# Altium schematic symbol library Diodes - TVS.SchLib: 5379 symbols (part 11 of 35) (continued)
## SD12-7 (continued)
TVS DIODE 12V 25V SOD323; Manufacturer: Diodes Incorporated; Capacitance @ Frequency: 150pF @ 1MHz; Current - Peak Pulse (10/1000µs): 15A (8/20µs); Power Line Protection: No; Power - Peak Pulse: 350W; Type: Zener; Unidirectional Channels: 1; Voltage - Breakdown (Min): 13.3V; Voltage - Reverse Standoff (Typ): 12V (Max); Part Number: SD12-7; Applications: General Purpose; ComponentLink1Description: Datasheet; ComponentLink1URL: https://www.diodes.com/assets/Datasheets/ds31772.pdf; ComponentLink2Description: DigiKey Link; ComponentLink2URL: http://digikey.com/product-detail/en/diodes-incorporated/SD12-7/SD12-7DICT-ND/5030159; LastUpdated: 9/2/2020 1:28:26 AM; Lifecycle Status: Active; Minimum Order: 1; Mounting Type: Surface Mount; Operating Temperature: -55°C ~ 150°C (TJ); Package / Case: SC-76, SOD-323; Packaging: TapeAndReel; PartId: 9842; Part Status: Active; Price: 0.07; Series: -; Supplier 1: DigiKey; Supplier Part Number 1: SD12-7DICT-ND; Supplier Device Package: SOD-323; Voltage - Clamping (Max) @ Ipp: 25V
footprint SOD323
pins: 1, 2

## SD12.TCT
designator D?
TVS DIODE 12V 25V SOD323; Manufacturer: Semtech Corporation; Capacitance @ Frequency: 150pF @ 1MHz; Current - Peak Pulse (10/1000µs): 15A (8/20µs); Power Line Protection: No; Power - Peak Pulse: 350W; Type: Zener; Unidirectional Channels: 1; Voltage - Breakdown (Min): 13.3V; Voltage - Reverse Standoff (Typ): 12V (Max); Part Number: SD12.TCT; Applications: General Purpose; ComponentLink1Description: Datasheet; ComponentLink1URL: https://www.semtech.com/uploads/documents/sdxx.pdf; ComponentLink2Description: DigiKey Link; ComponentLink2URL: http://digikey.com/product-detail/en/semtech-corporation/SD12.TCT/SD12.TCTCT-ND/5113731; LastUpdated: 9/2/2020 1:28:26 AM; Lifecycle Status: Active; Minimum Order: 1; Mounting Type: Surface Mount; Operating Temperature: -55°C ~ 125°C (TJ); Package / Case: SC-76, SOD-323; Packaging: TapeAndReel; PartId: 9851; Part Status: Active; Price: 0.33; Series: -; Supplier 1: DigiKey; Supplier Part Number 1: SD12.TCTCT-ND; Supplier Device Package: SOD-323; Voltage - Clamping (Max) @ Ipp: 25V
footprint SOD323
pins: 1, 2

## SD12C-01FTG
designator D?
TVS DIODE 12V 23V SOD323; Manufacturer: Littelfuse Inc.; Bidirectional Channels: 1; Capacitance @ Frequency: 100pF @ 1MHz; Current - Peak Pulse (10/1000µs): 17A (8/20µs); Power Line Protection: No; Power - Peak Pulse: 450W; Type: Zener; Voltage - Reverse Standoff (Typ): 12V (Max); Part Number: SD12C-01FTG; Applications: Automotive; ComponentLink1Description: Datasheet; ComponentLink1URL: https://www.littelfuse.com/~/media/electronics/datasheets/tvs_diode_arrays/littelfuse_tvs_diode_array_sd_c_datasheet.pdf.pdf; ComponentLink2Description: DigiKey Link; ComponentLink2URL: http://digikey.com/product-detail/en/littelfuse-inc/SD12C-01FTG/F6442CT-ND/5019594; LastUpdated: 9/2/2020 1:28:29 AM; Lifecycle Status: Active; Minimum Order: 1; Mounting Type: Surface Mount; Operating Temperature: -40°C ~ 125°C (TJ); Package / Case: SC-76, SOD-323; Packaging: TapeAndReel; PartId: 9965; Part Status: Active; Price: 0.12; Series: Automotive, AEC-Q101, SD-C, SPA®; Supplier 1: DigiKey; Supplier Part Number 1: F6442CT-ND; Supplier Device Package: SOD-323; Voltage - Clamping (Max) @ Ipp: 23V
footprint SOD323
pins: 1, 2

## SD12C-TP
designator D?
12V, ESD PROTECTION DEVICES, SOD; Manufacturer: Micro Commercial Co; Bidirectional Channels: 1; Capacitance @ Frequency: 100pF @ 1MHz (Max); Current - Peak Pulse (10/1000µs): 18A (8/20µs); Power Line Protection: No; Power - Peak Pulse: 500W; Type: Zener; Voltage - Breakdown (Min): 13.3V; Voltage - Clamping (Max) @ Ipp: 28V; Voltage - Reverse Standoff (Typ): 12V (Max); Part Number: SD12C-TP; Applications: General Purpose; ComponentLink2Description: DigiKey Link; ComponentLink2URL: http://digikey.com/product-detail/en/micro-commercial-co/SD12C-TP/353-SD12C-TPCT-ND/12177312; LastUpdated: 8/30/2020 9:07:52 PM; Lifecycle Status: Active; Minimum Order: 1; Mounting Type: Surface Mount; Operating Temperature: -55°C ~ 125°C (TJ); Package / Case: SC-76, SOD-323; Packaging: Unknown; PartId: 11458; Price: 0.07; Supplier 1: DigiKey; Supplier Part Number 1: 353-SD12C-TPCT-ND; Supplier Device Package: SOD-323
footprint SOD323
pins: 1, 2

## SD12C.TCT
designator D?
TVS DIODE 12V 24V SOD323; Manufacturer: Semtech Corporation; Bidirectional Channels: 1; Capacitance @ Frequency: 100pF @ 1MHz; Current - Peak Pulse (10/1000µs): 15A (8/20µs); Power Line Protection: No; Power - Peak Pulse: 350W; Type: Zener; Voltage - Breakdown (Min): 13.3V; Voltage - Reverse Standoff (Typ): 12V (Max); Part Number: SD12C.TCT; Applications: General Purpose; ComponentLink1Description: Datasheet; ComponentLink1URL: https://www.semtech.com/uploads/documents/sdxxc.pdf; ComponentLink2Description: DigiKey Link; ComponentLink2URL: http://digikey.com/product-detail/en/semtech-corporation/SD12C.TCT/SD12C.TCTCT-ND/5113732; LastUpdated: 9/2/2020 1:28:28 AM; Lifecycle Status: Active; Minimum Order: 1; Mounting Type: Surface Mount; Operating Temperature: -55°C ~ 125°C (TJ); Package / Case: SC-76, SOD-323; Packaging: TapeAndReel; PartId: 9916; Part Status: Active; Price: 0.36; Series: -; Supplier 1: DigiKey; Supplier Part Number 1: SD12C.TCTCT-ND; Supplier Device Package: SOD-323; Voltage - Clamping (Max) @ Ipp: 24V
footprint SOD323
pins: 1, 2

## SD12T1G
designator D?
TVS DIODE 12V 19V SOD323; Manufacturer: ON Semiconductor; Capacitance @ Frequency: 150pF @ 1MHz; Current - Peak Pulse (10/1000µs): 15A (8/20µs); Power Line Protection: No; Power - Peak Pulse: 350W; Type: Zener; Unidirectional Channels: 1; Voltage - Breakdown (Min): 13.3V; Part Number: SD12T1G; Applications: Automotive; ComponentLink1Description: Datasheet; ComponentLink1URL: https://www.onsemi.com/pub/Collateral/SD05T1-D.PDF; ComponentLink2Description: DigiKey Link; ComponentLink2URL: http://digikey.com/product-detail/en/on-semiconductor/SD12T1G/SD12T1GOSCT-ND/964631; LastUpdated: 9/2/2020 1:28:27 AM; Lifecycle Status: Active; Minimum Order: 1; Mounting Type: Surface Mount; Operating Temperature: -55°C ~ 150°C (TJ); Package / Case: SC-76, SOD-323; Packaging: TapeAndReel; PartId: 9856; Part Status: Active; Price: 0.08; Series: Automotive, AEC-Q101; Supplier 1: DigiKey; Supplier Part Number 1: SD12T1GOSCT-ND; Supplier Device Package: SOD-323; Voltage - Clamping (Max) @ Ipp: 19V; Voltage - Reverse Standoff (Typ): 12V
footprint SOD323
pins: 1, 2

## SD15-01FTG
designator D?
TVS DIODE 15V 30V SOD323; Manufacturer: Littelfuse Inc.; Capacitance @ Frequency: 100pF @ 1MHz; Current - Peak Pulse (10/1000µs): 12A (8/20µs); Power Line Protection: No; Power - Peak Pulse: 450W; Type: Zener; Unidirectional Channels: 1; Voltage - Reverse Standoff (Typ): 15V (Max); Part Number: SD15-01FTG; Applications: General Purpose; ComponentLink1Description: Datasheet; ComponentLink1URL: https://www.littelfuse.com/~/media/electronics/datasheets/tvs_diode_arrays/littelfuse_tvs_diode_array_sd_datasheet.pdf.pdf; ComponentLink2Description: DigiKey Link; ComponentLink2URL: http://digikey.com/product-detail/en/littelfuse-inc/SD15-01FTG/F6443CT-ND/5019596; LastUpdated: 9/2/2020 1:28:27 AM; Lifecycle Status: Active; Minimum Order: 1; Mounting Type: Surface Mount; Operating Temperature: -40°C ~ 125°C (TJ); Package / Case: SC-76, SOD-323; Packaging: TapeAndReel; PartId: 9874; Part Status: Active; Price: 0.11; Series: SD, SPA®; Supplier 1: DigiKey; Supplier Part Number 1: F6443CT-ND; Supplier Device Package: SOD-323; Voltage - Clamping (Max) @ Ipp: 30V
footprint SOD323
pins: 1, 2

## SD15C-01FTG
designator D?
TVS DIODE 15V 31V SOD323; Manufacturer: Littelfuse Inc.; Bidirectional Channels: 1; Capacitance @ Frequency: 75pF @ 1MHz; Current - Peak Pulse (10/1000µs): 12A (8/20µs); Power Line Protection: No; Power - Peak Pulse: 450W; Type: Zener; Voltage - Reverse Standoff (Typ): 15V (Max); Part Number: SD15C-01FTG; Applications: Automotive; ComponentLink1Description: Datasheet; ComponentLink1URL: https://www.littelfuse.com/~/media/electronics/datasheets/tvs_diode_arrays/littelfuse_tvs_diode_array_sd_c_datasheet.pdf.pdf; ComponentLink2Description: DigiKey Link; ComponentLink2URL: http://digikey.com/product-detail/en/littelfuse-inc/SD15C-01FTG/F6444CT-ND/5019598; LastUpdated: 9/2/2020 1:28:29 AM; Lifecycle Status: Active; Minimum Order: 1; Mounting Type: Surface Mount; Operating Temperature: -40°C ~ 125°C (TJ); Package / Case: SC-76, SOD-323; Packaging: TapeAndReel; PartId: 9989; Part Status: Active; Price: 0.12; Series: Automotive, AEC-Q101, SD-C, SPA®; Supplier 1: DigiKey; Supplier Part Number 1: F6444CT-ND; Supplier Device Package: SOD-323; Voltage - Clamping (Max) @ Ipp: 31V
footprint SOD323
pins: 1, 2

## SD15C-TP
designator D?
ESDPROTECTIONDEVICESSOD-323; Manufacturer: Micro Commercial Co; Bidirectional Channels: 1; Capacitance @ Frequency: 75pF @ 1MHz (Max); Current - Peak Pulse (10/1000µs): 12A (8/20µs); Power Line Protection: No; Power - Peak Pulse: 350W; Type: Zener; Voltage - Breakdown (Min): 16.7V; Voltage - Clamping (Max) @ Ipp: 40V; Voltage - Reverse Standoff (Typ): 15V (Max); Part Number: SD15C-TP; Applications: General Purpose; ComponentLink1Description: Datasheet; ComponentLink1URL: https://www.mccsemi.com/pdf/Products/SD15C~SD24C(SOD-323)-V1.pdf; ComponentLink2Description: DigiKey Link; ComponentLink2URL: http://digikey.com/product-detail/en/micro-commercial-co/SD15C-TP/SD15C-TPMSCT-ND/10054390; LastUpdated: 9/2/2020 1:28:29 AM; Lifecycle Status: Active; Minimum Order: 1; Mounting Type: Surface Mount; Operating Temperature: -55°C ~ 125°C (TJ); Package / Case: SC-76, SOD-323; Packaging: TapeAndReel; PartId: 9982; Part Status: Active; Price: 0.08; Series: -; Supplier 1: DigiKey; Supplier Part Number 1: SD15C-TPMSCT-ND; Supplier Device Package: SOD-323
footprint SOD323
pins: 1, 2

## SD15C.TCT
designator D?
TVS DIODE 15V 29V SOD323; Manufacturer: Semtech Corporation; Bidirectional Channels: 1; Capacitance @ Frequency: 75pF @ 1MHz; Current - Peak Pulse (10/1000µs): 12A (8/20µs); Power Line Protection: No; Power - Peak Pulse: 350W; Type: Zener; Voltage - Breakdown (Min): 16.7V; Voltage - Reverse Standoff (Typ): 15V (Max); Part Number: SD15C.TCT; Applications: General Purpose; ComponentLink1Description: Datasheet; ComponentLink1URL: https://www.semtech.com/uploads/documents/sdxxc.pdf; ComponentLink2Description: DigiKey Link; ComponentLink2URL: http://digikey.com/product-detail/en/semtech-corporation/SD15C.TCT/SD15C.TCTCT-ND/5113733; LastUpdated: 9/2/2020 1:28:28 AM; Lifecycle Status: Active; Minimum Order: 1; Mounting Type: Surface Mount; Operating Temperature: -55°C ~ 125°C (TJ); Package / Case: SC-76, SOD-323; Packaging: TapeAndReel; PartId: 9915; Part Status: Active; Price: 0.36; Series: -; Supplier 1: DigiKey; Supplier Part Number 1: SD15C.TCTCT-ND; Supplier Device Package: SOD-323; Voltage - Clamping (Max) @ Ipp: 29V
footprint SOD323
pins: 1, 2

## SD24-01FTG
designator D?
TVS DIODE 24V 42V SOD323; Manufacturer: Littelfuse Inc.; Capacitance @ Frequency: 65pF @ 1MHz; Current - Peak Pulse (10/1000µs): 7A (8/20µs); Power Line Protection: No; Power - Peak Pulse: 450W; Type: Zener; Unidirectional Channels: 1; Voltage - Reverse Standoff (Typ): 24V (Max); Part Number: SD24-01FTG; Applications: General Purpose; ComponentLink1Description: Datasheet; ComponentLink1URL: https://www.littelfuse.com/~/media/electronics/datasheets/tvs_diode_arrays/littelfuse_tvs_diode_array_sd_datasheet.pdf.pdf; ComponentLink2Description: DigiKey Link; ComponentLink2URL: http://digikey.com/product-detail/en/littelfuse-inc/SD24-01FTG/F6445CT-ND/5019600; LastUpdated: 9/2/2020 1:28:27 AM; Lifecycle Status: Active; Minimum Order: 1; Mounting Type: Surface Mount; Operating Temperature: -40°C ~ 125°C (TJ); Package / Case: SC-76, SOD-323; Packaging: TapeAndReel; PartId: 9912; Part Status: Active; Price: 0.11; Series: SD, SPA®; Supplier 1: DigiKey; Supplier Part Number 1: F6445CT-ND; Supplier Device Package: SOD-323; Voltage - Clamping (Max) @ Ipp: 42V
footprint SOD323
pins: 1, 2

## SD24-7
designator D?
SURGE PROTECTION PP SOD323; Manufacturer: Diodes Incorporated; Capacitance @ Frequency: 80pF @ 1MHz (Max); Current - Peak Pulse (10/1000µs): 8A (8/20µs); Power Line Protection: No; Power - Peak Pulse: 350W; Type: Zener; Unidirectional Channels: 1; Voltage - Breakdown (Min): 26V; Voltage - Clamping (Max) @ Ipp: 44V; Voltage - Reverse Standoff (Typ): 24V (Max); Part Number: SD24-7; Applications: General Purpose; ComponentLink1Description: Datasheet; ComponentLink1URL: https://www.diodes.com/assets/Datasheets/SD24.pdf; ComponentLink2Description: DigiKey Link; ComponentLink2URL: http://digikey.com/product-detail/en/diodes-incorporated/SD24-7/31-SD24-7CT-ND/11643306; LastUpdated: 8/30/2020 9:07:50 PM; Lifecycle Status: Active; Minimum Order: 1; Mounting Type: Surface Mount; Package / Case: SC-76, SOD-323; Packaging: TapeAndReel; PartId: 11455; Price: 0.10; Supplier 1: DigiKey; Supplier Part Number 1: 31-SD24-7CT-ND; Supplier Device Package: SOD-323
footprint SOD323
pins: 1, 2

## SD24C-01FTG
designator D?
TVS DIODE 24V 42V SOD323; Manufacturer: Littelfuse Inc.; Bidirectional Channels: 1; Capacitance @ Frequency: 50pF @ 1MHz; Current - Peak Pulse (10/1000µs): 7A (8/20µs); Power Line Protection: No; Power - Peak Pulse: 450W; Type: Zener; Voltage - Reverse Standoff (Typ): 24V (Max); Part Number: SD24C-01FTG; Applications: Automotive; ComponentLink1Description: Datasheet; ComponentLink1URL: https://www.littelfuse.com/~/media/electronics/datasheets/tvs_diode_arrays/littelfuse_tvs_diode_array_sd_c_datasheet.pdf.pdf; ComponentLink2Description: DigiKey Link; ComponentLink2URL: http://digikey.com/product-detail/en/littelfuse-inc/SD24C-01FTG/F6446CT-ND/5019602; LastUpdated: 9/2/2020 1:28:29 AM; Lifecycle Status: Active; Minimum Order: 1; Mounting Type: Surface Mount; Operating Temperature: -40°C ~ 125°C (TJ); Package / Case: SC-76, SOD-323; Packaging: TapeAndReel; PartId: 9990; Part Status: Active; Price: 0.12; Series: Automotive, AEC-Q101, SD-C, SPA®; Supplier 1: DigiKey; Supplier Part Number 1: F6446CT-ND; Supplier Device Package: SOD-323; Voltage - Clamping (Max) @ Ipp: 42V
footprint SOD323
pins: 1, 2

## SD24C-7
designator D?
GENERAL PROTECTION PP SOD323; Manufacturer: Diodes Incorporated; Bidirectional Channels: 1; Capacitance @ Frequency: 40pF @ 1MHz (Max); Current - Peak Pulse (10/1000µs): 8A (8/20µs); Power Line Protection: No; Power - Peak Pulse: 350W; Type: Zener; Voltage - Breakdown (Min): 26.7V; Voltage - Clamping (Max) @ Ipp: 45V; Voltage - Reverse Standoff (Typ): 24V (Max); Part Number: SD24C-7; Applications: General Purpose; ComponentLink1Description: Datasheet; ComponentLink1URL: https://www.diodes.com/assets/Datasheets/SD24C.pdf; ComponentLink2Description: DigiKey Link; ComponentLink2URL: http://digikey.com/product-detail/en/diodes-incorporated/SD24C-7/31-SD24C-7CT-ND/10706907; LastUpdated: 9/2/2020 1:28:28 AM; Lifecycle Status: Active; Minimum Order: 1; Mounting Type: Surface Mount; Operating Temperature: -65°C ~ 150°C (TJ); Package / Case: SC-76, SOD-323; Packaging: TapeAndReel; PartId: 9913; Part Status: Active; Price: 0.11; Series: -; Supplier 1: DigiKey; Supplier Part Number 1: 31-SD24C-7CT-ND; Supplier Device Package: SOD-323
footprint SOD323
pins: 1, 2

## SD24C-TP
designator D?
24V,ESD PROTECTION DEVICES,SOD-3; Manufacturer: Micro Commercial Co; Bidirectional Channels: 1; Capacitance @ Frequency: 50pF @ 1MHz (Max); Current - Peak Pulse (10/1000µs): 8A (8/20µs); Power Line Protection: No; Power - Peak Pulse: 350W; Type: Zener; Voltage - Breakdown (Min): 26.7V; Voltage - Clamping (Max) @ Ipp: 62V; Voltage - Reverse Standoff (Typ): 24V (Max); Part Number: SD24C-TP; Applications: General Purpose; ComponentLink1Description: Datasheet; ComponentLink1URL: https://www.mccsemi.com/pdf/Products/SD15C~SD24C(SOD-323)-C.pdf; ComponentLink2Description: DigiKey Link; ComponentLink2URL: http://digikey.com/product-detail/en/micro-commercial-co/SD24C-TP/SD24C-TPMSCT-ND/8554546; LastUpdated: 9/2/2020 1:28:29 AM; Lifecycle Status: Active; Minimum Order: 1; Mounting Type: Surface Mount; Operating Temperature: -55°C ~ 125°C (TJ); Package / Case: SC-76, SOD-323; Packaging: TapeAndReel; PartId: 9977; Part Status: Active; Price: 0.08; Series: -; Supplier 1: DigiKey; Supplier Part Number 1: SD24C-TPMSCT-ND; Supplier Device Package: SOD-323
footprint SOD323
pins: 1, 2

## SD24C.TCT
designator D?
TVS DIODE 24V 44V SOD323; Manufacturer: Semtech Corporation; Bidirectional Channels: 1; Capacitance @ Frequency: 50pF @ 1MHz; Current - Peak Pulse (10/1000µs): 8A (8/20µs); Power Line Protection: No; Power - Peak Pulse: 350W; Type: Zener; Voltage - Breakdown (Min): 26.7V; Voltage - Reverse Standoff (Typ): 24V (Max); Part Number: SD24C.TCT; Applications: General Purpose; ComponentLink1Description: Datasheet; ComponentLink1URL: https://www.semtech.com/uploads/documents/sdxxc.pdf; ComponentLink2Description: DigiKey Link; ComponentLink2URL: http://digikey.com/product-detail/en/semtech-corporation/SD24C.TCT/SD24CCT-ND/1000967; LastUpdated: 9/2/2020 1:28:29 AM; Lifecycle Status: Active; Minimum Order: 1; Mounting Type: Surface Mount; Operating Temperature: -55°C ~ 125°C (TJ); Package / Case: SC-76, SOD-323; Packaging: TapeAndReel; PartId: 9961; Part Status: Active; Price: 0.33; Series: -; Supplier 1: DigiKey; Supplier Part Number 1: SD24CCT-ND; Supplier Device Package: SOD-323; Voltage - Clamping (Max) @ Ipp: 44V
footprint SOD323
pins: 1, 2

## SD36-01FTG
designator D?
TVS DIODE 36V 62V SOD323; Manufacturer: Littelfuse Inc.; Capacitance @ Frequency: 50pF @ 1MHz; Current - Peak Pulse (10/1000µs): 5A (8/20µs); Power Line Protection: No; Power - Peak Pulse: 450W; Type: Zener; Unidirectional Channels: 1; Voltage - Reverse Standoff (Typ): 36V (Max); Part Number: SD36-01FTG; Applications: General Purpose; ComponentLink1Description: Datasheet; ComponentLink1URL: https://www.littelfuse.com/~/media/electronics/datasheets/tvs_diode_arrays/littelfuse_tvs_diode_array_sd_datasheet.pdf.pdf; ComponentLink2Description: DigiKey Link; ComponentLink2URL: http://digikey.com/product-detail/en/littelfuse-inc/SD36-01FTG/F6447CT-ND/5019604; LastUpdated: 9/2/2020 1:28:27 AM; Lifecycle Status: Active; Minimum Order: 1; Mounting Type: Surface Mount; Operating Temperature: -40°C ~ 125°C (TJ); Package / Case: SC-76, SOD-323; Packaging: TapeAndReel; PartId: 9873; Part Status: Active; Price: 0.11; Series: SD, SPA®; Supplier 1: DigiKey; Supplier Part Number 1: F6447CT-ND; Supplier Device Package: SOD-323; Voltage - Clamping (Max) @ Ipp: 62V
footprint SOD323
pins: 1, 2

## SD36C-01FTG
designator D?
TVS DIODE 36V 60V SOD323; Manufacturer: Littelfuse Inc.; Bidirectional Channels: 1; Capacitance @ Frequency: 30pF @ 1MHz; Current - Peak Pulse (10/1000µs): 5A (8/20µs); Power Line Protection: No; Power - Peak Pulse: 450W; Type: Zener; Voltage - Reverse Standoff (Typ): 36V (Max); Part Number: SD36C-01FTG; Applications: Automotive; ComponentLink1Description: Datasheet; ComponentLink1URL: https://www.littelfuse.com/~/media/electronics/datasheets/tvs_diode_arrays/littelfuse_tvs_diode_array_sd_c_datasheet.pdf.pdf; ComponentLink2Description: DigiKey Link; ComponentLink2URL: http://digikey.com/product-detail/en/littelfuse-inc/SD36C-01FTG/F6448CT-ND/5019606; LastUpdated: 9/2/2020 1:28:29 AM; Lifecycle Status: Active; Minimum Order: 1; Mounting Type: Surface Mount; Operating Temperature: -40°C ~ 125°C (TJ); Package / Case: SC-76, SOD-323; Packaging: TapeAndReel; PartId: 9988; Part Status: Active; Price: 0.12; Series: Automotive, AEC-Q101, SD-C, SPA®; Supplier 1: DigiKey; Supplier Part Number 1: F6448CT-ND; Supplier Device Package: SOD-323; Voltage - Clamping (Max) @ Ipp: 60V
footprint SOD323
pins: 1, 2

## SD36C-TP
designator D?
ESDPROTECTIONDEVICESSOD-323; Manufacturer: Micro Commercial Co; Bidirectional Channels: 1; Capacitance @ Frequency: 10pF @ 1MHz; Current - Peak Pulse (10/1000µs): 3A (8/20µs); Power Line Protection: No; Power - Peak Pulse: 240W; Type: Zener; Voltage - Breakdown (Min): 40V; Voltage - Clamping (Max) @ Ipp: 80V; Voltage - Reverse Standoff (Typ): 36V (Max); Part Number: SD36C-TP; Applications: General Purpose; ComponentLink1Description: Datasheet; ComponentLink1URL: https://www.mccsemi.com/pdf/Products/SD36C(SOD-323)-V1.pdf; ComponentLink2Description: DigiKey Link; ComponentLink2URL: http://digikey.com/product-detail/en/micro-commercial-co/SD36C-TP/SD36C-TPMSCT-ND/10054391; LastUpdated: 9/2/2020 1:28:29 AM; Lifecycle Status: Active; Minimum Order: 1; Mounting Type: Surface Mount; Operating Temperature: -55°C ~ 150°C (TJ); Package / Case: SC-76, SOD-323; Packaging: TapeAndReel; PartId: 9981; Part Status: Active; Price: 0.08; Series: -; Supplier 1: DigiKey; Supplier Part Number 1: SD36C-TPMSCT-ND; Supplier Device Package: SOD-323
footprint SOD323
pins: 1, 2

## SD32305TR
designator D?
TVS DIODE 5V 9.8V SOD323; Manufacturer: SMC Diode Solutions; Capacitance @ Frequency: 600pF @ 1MHz; Current - Peak Pulse (10/1000µs): 1A (8/20µs); Power Line Protection: No; Power - Peak Pulse: 300W; Type: Zener; Unidirectional Channels: 1; Voltage - Breakdown (Min): 6V; Voltage - Reverse Standoff (Typ): 5V (Max); Part Number: SD32305TR; Applications: General Purpose; ComponentLink1Description: Datasheet; ComponentLink1URL: http://www.smc-diodes.com/propdf/SD32303%20THRU%20SD32324%20N0428%20REV.B.pdf; ComponentLink2Description: DigiKey Link; ComponentLink2URL: http://digikey.com/product-detail/en/smc-diode-solutions/SD32305TR/1655-1528-1-ND/6022973; LastUpdated: 9/2/2020 1:28:26 AM; Lifecycle Status: Active; Minimum Order: 1; Mounting Type: Surface Mount; Operating Temperature: -55°C ~ 125°C (TJ); Package / Case: SC-76, SOD-323; Packaging: TapeAndReel; PartId: 9844; Part Status: Active; Price: 0.04; Series: -; Supplier 1: DigiKey; Supplier Part Number 1: 1655-1528-1-ND; Supplier Device Package: SOD-323; Voltage - Clamping (Max) @ Ipp: 9.8V
footprint SOD323
pins: 1, 2

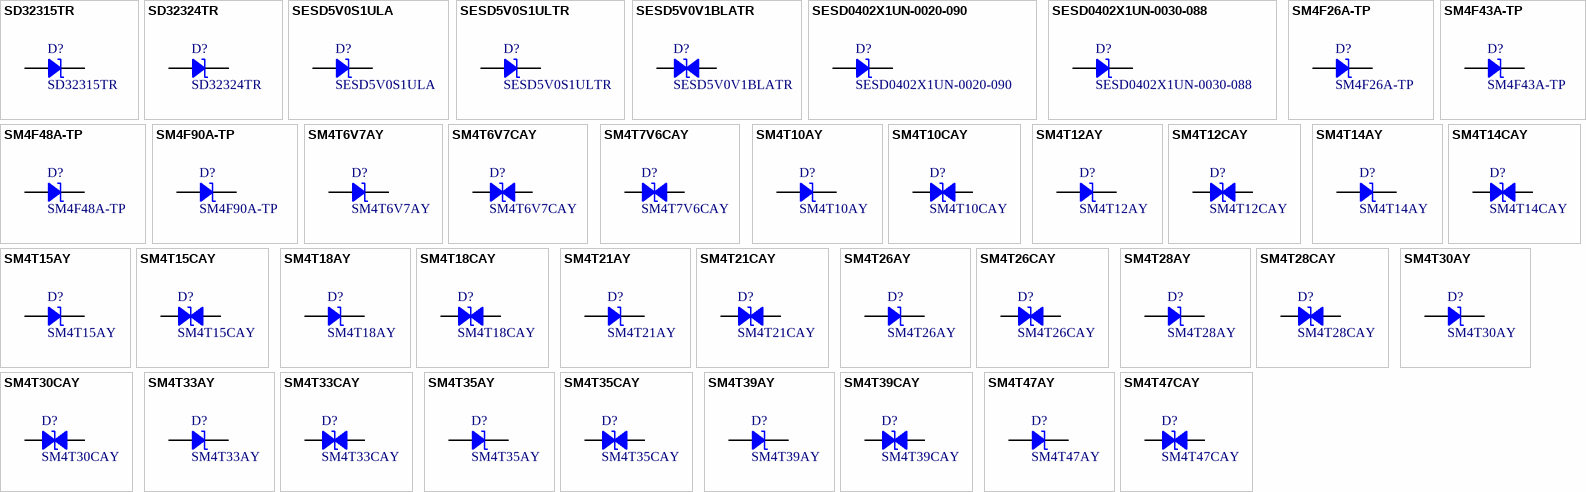
[diagram p40: symbols SD32315TR to SM4T47CAY]

## SD32315TR
designator D?
TVS DIODE 15V 24V SOD323; Manufacturer: SMC Diode Solutions; Capacitance @ Frequency: 140pF @ 1MHz; Current - Peak Pulse (10/1000µs): 1A (8/20µs); Power Line Protection: No; Power - Peak Pulse: 300W; Type: Zener; Unidirectional Channels: 1; Voltage - Breakdown (Min): 16.7V; Voltage - Reverse Standoff (Typ): 15V (Max); Part Number: SD32315TR; Applications: General Purpose; ComponentLink1Description: Datasheet; ComponentLink1URL: http://www.smc-diodes.com/propdf/SD32303%20THRU%20SD32324%20N0428%20REV.B.pdf; ComponentLink2Description: DigiKey Link; ComponentLink2URL: http://digikey.com/product-detail/en/smc-diode-solutions/SD32315TR/1655-1529-1-ND/6022974; LastUpdated: 9/2/2020 1:28:27 AM; Lifecycle Status: Active; Minimum Order: 1; Mounting Type: Surface Mount; Operating Temperature: -55°C ~ 125°C (TJ); Package / Case: SC-76, SOD-323; Packaging: TapeAndReel; PartId: 9905; Part Status: Active; Price: 0.07; Series: -; Supplier 1: DigiKey; Supplier Part Number 1: 1655-1529-1-ND; Supplier Device Package: SOD-323; Voltage - Clamping (Max) @ Ipp: 24V
footprint SOD323
pins: 1, 2

## SD32324TR
designator D?
TVS DIODE 24V 43V SOD323; Manufacturer: SMC Diode Solutions; Capacitance @ Frequency: 90pF @ 1MHz; Current - Peak Pulse (10/1000µs): 1A; Power Line Protection: No; Power - Peak Pulse: 300W; Type: Zener; Unidirectional Channels: 1; Voltage - Breakdown (Min): 26.7V; Voltage - Reverse Standoff (Typ): 24V (Max); Part Number: SD32324TR; Applications: General Purpose; ComponentLink1Description: Datasheet; ComponentLink1URL: http://www.smc-diodes.com/propdf/SD32303%20THRU%20SD32324%20N0428%20REV.B.pdf; ComponentLink2Description: DigiKey Link; ComponentLink2URL: http://digikey.com/product-detail/en/smc-diode-solutions/SD32324TR/1655-2000-1-ND/9562567; LastUpdated: 9/2/2020 1:28:26 AM; Lifecycle Status: Active; Minimum Order: 1; Mounting Type: Surface Mount; Operating Temperature: -55°C ~ 125°C (TJ); Package / Case: SC-76, SOD-323; Packaging: TapeAndReel; PartId: 9843; Part Status: Active; Price: 0.04; Series: -; Supplier 1: DigiKey; Supplier Part Number 1: 1655-2000-1-ND; Supplier Device Package: SOD-323; Voltage - Clamping (Max) @ Ipp: 43V
footprint SOD323
pins: 1, 2

## SESD5V0S1ULA
designator D?
DIODE ESD 5V DFN1006; Manufacturer: SMC Diode Solutions; Capacitance @ Frequency: 120pF @ 1MHz; Current - Peak Pulse (10/1000µs): 11A (8/20µs); Power Line Protection: No; Power - Peak Pulse: 110W; Type: Zener; Unidirectional Channels: 1; Voltage - Breakdown (Min): 6.4V; Voltage - Clamping (Max) @ Ipp: 12V; Voltage - Reverse Standoff (Typ): 5V (Max); Part Number: SESD5V0S1ULA; Applications: Automotive, Telecom; ComponentLink1Description: Datasheet; ComponentLink1URL: http://www.smc-diodes.com/propdf/SESD5V0S1ULA%20N2082%20REV.-.pdf; ComponentLink2Description: DigiKey Link; ComponentLink2URL: http://digikey.com/product-detail/en/smc-diode-solutions/SESD5V0S1ULA/1655-2134-1-ND/9806083; Device Package: 0402 (1006 Metric); LastUpdated: 9/2/2020 1:28:45 AM; Lifecycle Status: Active; Minimum Order: 1; Mounting Type: Surface Mount; Operating Temperature: 150°C (TJ); Package / Case: 0402 (1006 Metric); Packaging: TapeAndReel; PartId: 10388; Part Status: Active; Price: 0.10; Series: Automotive, AEC-Q101; Supplier 1: DigiKey; Supplier Part Number 1: 1655-2134-1-ND; Supplier Device Package: DFN1006-2L
footprint 0402
pins: 1, 2

## SESD5V0S1ULTR
designator D?
DIODE ESD 5V DFN1006; Manufacturer: SMC Diode Solutions; Capacitance @ Frequency: 150pF @ 1MHz; Current - Peak Pulse (10/1000µs): 15A; Power Line Protection: No; Power - Peak Pulse: 150W; Type: Steering (Rail to Rail); Unidirectional Channels: 1; Voltage - Breakdown (Min): 6.4V; Voltage - Clamping (Max) @ Ipp: 20V; Voltage - Reverse Standoff (Typ): 5V (Max); Part Number: SESD5V0S1ULTR; Applications: Automotive; ComponentLink1Description: Datasheet; ComponentLink1URL: http://www.smc-diodes.com/propdf/SESD5V0S1UL%20N2128%20REV.-.pdf; ComponentLink2Description: DigiKey Link; ComponentLink2URL: http://digikey.com/product-detail/en/smc-diode-solutions/SESD5V0S1ULTR/1655-2180-1-ND/10071820; Device Package: 0402 (1006 Metric); LastUpdated: 9/2/2020 1:28:45 AM; Lifecycle Status: Active; Minimum Order: 1; Mounting Type: Surface Mount; Operating Temperature: 150°C (TJ); Package / Case: 0402 (1006 Metric); Packaging: TapeAndReel; PartId: 10400; Part Status: Active; Price: 0.09; Series: Automotive, AEC-Q101; Supplier 1: DigiKey; Supplier Part Number 1: 1655-2180-1-ND; Supplier Device Package: DFN1006-2L
footprint 0402
pins: 1, 2

## SESD5V0V1BLATR
designator D?
DIODE ESD 5V BIDIRECTIONAL DFN10; Manufacturer: SMC Diode Solutions; Bidirectional Channels: 1; Capacitance @ Frequency: 15pF @ 1MHz; Current - Peak Pulse (10/1000µs): 4A (8/20µs); Power Line Protection: No; Power - Peak Pulse: 45W; Type: Zener; Voltage - Breakdown (Min): 5.8V; Voltage - Clamping (Max) @ Ipp: 12.5V; Voltage - Reverse Standoff (Typ): 5V (Max); Part Number: SESD5V0V1BLATR; Applications: General Purpose; ComponentLink1Description: Datasheet; ComponentLink1URL: //media.digikey.com/pdf/Data%20Sheets/SMC%20Diodes/SESD5V0V1BLA%20N2129%20REV.-.pdf; ComponentLink2Description: DigiKey Link; ComponentLink2URL: http://digikey.com/product-detail/en/smc-diode-solutions/SESD5V0V1BLATR/1655-2181-1-ND/10071821; Device Package: 0402 (1006 Metric); LastUpdated: 9/2/2020 1:28:49 AM; Lifecycle Status: Active; Minimum Order: 1; Mounting Type: Surface Mount; Operating Temperature: 150°C (TJ); Package / Case: 0402 (1006 Metric); Packaging: TapeAndReel; PartId: 10470; Part Status: Active; Price: 0.11; Series: -; Supplier 1: DigiKey; Supplier Part Number 1: 1655-2181-1-ND; Supplier Device Package: DFN1006-2L
footprint 0402
pins: 1, 2

## SESD0402X1UN-0020-090
designator D?
TVS DIODE 7V 9.2V 0402/2DFN; Manufacturer: Littelfuse Inc.; Capacitance @ Frequency: 0.2pF @ 3GHz; Current - Peak Pulse (10/1000µs): 2A (8/20µs); Power Line Protection: No; Type: Zener; Unidirectional Channels: 1; Voltage - Breakdown (Min): 9V (Typ); Voltage - Clamping (Max) @ Ipp: 9.2V (Typ); Voltage - Reverse Standoff (Typ): 7V (Max); Part Number: SESD0402X1UN-0020-090; Applications: Automotive, HDMI; ComponentLink1Description: Datasheet; ComponentLink1URL: https://www.littelfuse.com/~/media/electronics/datasheets/tvs_diode_arrays/littelfuse_tvs_diode_array_sesd_ultra_low_capacitance_discrete_tvs_datasheet.pdf.pdf; ComponentLink2Description: DigiKey Link; ComponentLink2URL: http://digikey.com/product-detail/en/littelfuse-inc/SESD0402X1UN-0020-090/SESD0402X1UN-0020-090CT-ND/5233523; Device Package: 0402 (1006 Metric); LastUpdated: 9/2/2020 1:28:45 AM; Lifecycle Status: Active; Minimum Order: 1; Mounting Type: Surface Mount; Operating Temperature: -55°C ~ 125°C (TJ); Package / Case: 0402 (1006 Metric); Packaging: TapeAndReel; PartId: 10402; Part Status: Active; Price: 0.16; Series: Automotive, AEC-Q101, SESD, SPA®; Supplier 1: DigiKey; Supplier Part Number 1: SESD0402X1UN-0020-090CT-ND; Supplier Device Package: 0402/2DFN (1x0.60)
footprint 0402
pins: 1, 2

## SESD0402X1UN-0030-088
designator D?
TVS DIODE 7V 13V 0402/2DFN; Manufacturer: Littelfuse Inc.; Capacitance @ Frequency: 0.3pF @ 3GHz; Current - Peak Pulse (10/1000µs): 2.5A (8/20µs); Power Line Protection: No; Type: Zener; Unidirectional Channels: 1; Voltage - Breakdown (Min): 8.8V (Typ); Voltage - Clamping (Max) @ Ipp: 13V (Typ); Voltage - Reverse Standoff (Typ): 7V (Max); Part Number: SESD0402X1UN-0030-088; Applications: Automotive, HDMI; ComponentLink1Description: Datasheet; ComponentLink1URL: https://www.littelfuse.com/~/media/electronics/datasheets/tvs_diode_arrays/littelfuse_tvs_diode_array_sesd_enhanced_esd_discrete_tvs_datasheet.pdf.pdf; ComponentLink2Description: DigiKey Link; ComponentLink2URL: http://digikey.com/product-detail/en/littelfuse-inc/SESD0402X1UN-0030-088/SESD0402X1UN-0030-088CT-ND/5233531; Device Package: 0402 (1006 Metric); LastUpdated: 9/2/2020 1:28:45 AM; Lifecycle Status: Active; Minimum Order: 1; Mounting Type: Surface Mount; Operating Temperature: -55°C ~ 125°C (TA); Package / Case: 0402 (1006 Metric); Packaging: TapeAndReel; PartId: 10379; Part Status: Active; Price: 0.14; Series: Automotive, AEC-Q101, SESD, SPA®; Supplier 1: DigiKey; Supplier Part Number 1: SESD0402X1UN-0030-088CT-ND; Supplier Device Package: 0402/2DFN (1x0.60)
footprint 0402
pins: 1, 2

## SM4F26A-TP
designator D?
400WTVSSOD-123FL; Manufacturer: Micro Commercial Co; Current - Peak Pulse (10/1000µs): 9.5A; Power Line Protection: No; Power - Peak Pulse: 400W; Type: Zener; Unidirectional Channels: 1; Voltage - Breakdown (Min): 28.9V; Voltage - Clamping (Max) @ Ipp: 42.1V; Voltage - Reverse Standoff (Typ): 26V; Part Number: SM4F26A-TP; Applications: General Purpose; ComponentLink1Description: Datasheet; ComponentLink1URL: https://www.mccsemi.com/pdf/Products/SM4F5.0A-170A(SOD-123FL)-V1.pdf; ComponentLink2Description: DigiKey Link; ComponentLink2URL: http://digikey.com/product-detail/en/micro-commercial-co/SM4F26A-TP/SM4F26A-TPMSCT-ND/10054415; LastUpdated: 9/2/2020 1:28:37 AM; Lifecycle Status: Active; Minimum Order: 1; Mounting Type: Surface Mount; Operating Temperature: -55°C ~ 150°C (TJ); Package / Case: SOD-123F; Packaging: TapeAndReel; PartId: 10167; Part Status: Active; Price: 0.13; Series: -; Supplier 1: DigiKey; Supplier Part Number 1: SM4F26A-TPMSCT-ND; Supplier Device Package: SOD-123FL
footprint SOD123F
pins: 1, 2

## SM4F43A-TP
designator D?
43V, 400W, UNIDIRECTIONAL TVS, S; Manufacturer: Micro Commercial Co; Current - Peak Pulse (10/1000µs): 5.7A; Power Line Protection: No; Type: Zener; Unidirectional Channels: 1; Voltage - Breakdown (Min): 47.8V; Voltage - Clamping (Max) @ Ipp: 69.4V; Part Number: SM4F43A-TP; Applications: General Purpose; ComponentLink1Description: Datasheet; ComponentLink1URL: https://www.mccsemi.com/pdf/Products/SM4F5.0A-170A(SOD-123FL)-B.pdf; ComponentLink2Description: DigiKey Link; ComponentLink2URL: http://digikey.com/product-detail/en/micro-commercial-co/SM4F43A-TP/SM4F43A-TPMSCT-ND/8554559; LastUpdated: 9/2/2020 1:28:37 AM; Lifecycle Status: Active; Minimum Order: 1; Mounting Type: Surface Mount; Operating Temperature: -55°C ~ 150°C (TA); Package / Case: SOD-123F; Packaging: TapeAndReel; PartId: 10165; Part Status: Active; Power - Peak Pulse: 400W; Price: 0.13; Series: -; Supplier 1: DigiKey; Supplier Part Number 1: SM4F43A-TPMSCT-ND; Supplier Device Package: SOD-123FL; Voltage - Reverse Standoff (Typ): 43V
footprint SOD123F
pins: 1, 2

## SM4F48A-TP
designator D?
400WTVSSOD-123FL; Manufacturer: Micro Commercial Co; Current - Peak Pulse (10/1000µs): 5.2A; Power Line Protection: No; Power - Peak Pulse: 400W; Type: Zener; Unidirectional Channels: 1; Voltage - Breakdown (Min): 53.3V; Voltage - Clamping (Max) @ Ipp: 77.4V; Voltage - Reverse Standoff (Typ): 48V; Part Number: SM4F48A-TP; Applications: General Purpose; ComponentLink1Description: Datasheet; ComponentLink1URL: https://www.mccsemi.com/pdf/Products/SM4F5.0A-170A(SOD-123FL)-V1.pdf; ComponentLink2Description: DigiKey Link; ComponentLink2URL: http://digikey.com/product-detail/en/micro-commercial-co/SM4F48A-TP/SM4F48A-TPMSCT-ND/10054416; LastUpdated: 9/2/2020 1:28:37 AM; Lifecycle Status: Active; Minimum Order: 1; Mounting Type: Surface Mount; Operating Temperature: -55°C ~ 150°C (TJ); Package / Case: SOD-123F; Packaging: TapeAndReel; PartId: 10168; Part Status: Active; Price: 0.13; Series: -; Supplier 1: DigiKey; Supplier Part Number 1: SM4F48A-TPMSCT-ND; Supplier Device Package: SOD-123FL
footprint SOD123F
pins: 1, 2

## SM4F90A-TP
designator D?
90V, 400W, UNIDIRECTIONAL TVS, S; Manufacturer: Micro Commercial Co; Current - Peak Pulse (10/1000µs): 2.7A; Power Line Protection: No; Type: Zener; Unidirectional Channels: 1; Voltage - Breakdown (Min): 100V; Voltage - Clamping (Max) @ Ipp: 146V; Part Number: SM4F90A-TP; Applications: General Purpose; ComponentLink1Description: Datasheet; ComponentLink1URL: https://www.mccsemi.com/pdf/Products/SM4F5.0A-170A(SOD-123FL)-B.pdf; ComponentLink2Description: DigiKey Link; ComponentLink2URL: http://digikey.com/product-detail/en/micro-commercial-co/SM4F90A-TP/SM4F90A-TPMSCT-ND/8554560; LastUpdated: 9/2/2020 1:28:37 AM; Lifecycle Status: Active; Minimum Order: 1; Mounting Type: Surface Mount; Operating Temperature: -55°C ~ 150°C (TA); Package / Case: SOD-123F; Packaging: TapeAndReel; PartId: 10169; Part Status: Active; Power - Peak Pulse: 400W; Price: 0.13; Series: -; Supplier 1: DigiKey; Supplier Part Number 1: SM4F90A-TPMSCT-ND; Supplier Device Package: SOD-123FL; Voltage - Reverse Standoff (Typ): 90V
footprint SOD123F
pins: 1, 2

## SM4T6V7AY
designator D?
TVS DIODE 5V 13.4V SMA; Manufacturer: STMicroelectronics; Current - Peak Pulse (10/1000µs): 174A (8/20µs); Power Line Protection: No; Power - Peak Pulse: 400W; Type: Zener; Unidirectional Channels: 1; Voltage - Breakdown (Min): 6.4V; Part Number: SM4T6V7AY; Applications: Automotive; ComponentLink1Description: Datasheet; ComponentLink1URL: http://www.st.com/content/ccc/resource/technical/document/datasheet/8f/86/c4/c9/63/e2/4c/58/CD00283395.pdf/files/CD00283395.pdf/jcr:content/translations/en.CD00283395.pdf; ComponentLink2Description: DigiKey Link; ComponentLink2URL: http://digikey.com/product-detail/en/stmicroelectronics/SM4T6V7AY/497-11798-1-ND/2756610; LastUpdated: 9/2/2020 1:20:14 AM; Lifecycle Status: Active; Minimum Order: 1; Mounting Type: Surface Mount; Operating Temperature: -55°C ~ 150°C (TJ); Package / Case: DO-214AC, SMA; Packaging: TapeAndReel; PartId: 5731; Part Status: Active; Price: 0.17; Series: Automotive, AEC-Q101, SM4TY, TRANSIL™; Supplier 1: DigiKey; Supplier Part Number 1: 497-11798-1-ND; Supplier Device Package: SMA (DO-214AC); Voltage - Clamping (Max) @ Ipp: 13.4V; Voltage - Reverse Standoff (Typ): 5V
footprint DO214AC SMA
pins: 1, 2

## SM4T6V7CAY
designator D?
TVS DIODE 5V 13.4V SMA; Manufacturer: STMicroelectronics; Bidirectional Channels: 1; Current - Peak Pulse (10/1000µs): 174A (8/20µs); Power Line Protection: No; Power - Peak Pulse: 400W; Type: Zener; Voltage - Breakdown (Min): 6.4V; Part Number: SM4T6V7CAY; Applications: Automotive; ComponentLink1Description: Datasheet; ComponentLink1URL: http://www.st.com/content/ccc/resource/technical/document/datasheet/8f/86/c4/c9/63/e2/4c/58/CD00283395.pdf/files/CD00283395.pdf/jcr:content/translations/en.CD00283395.pdf; ComponentLink2Description: DigiKey Link; ComponentLink2URL: http://digikey.com/product-detail/en/stmicroelectronics/SM4T6V7CAY/497-10932-1-ND/2522555; LastUpdated: 9/2/2020 1:27:53 AM; Lifecycle Status: Active; Minimum Order: 1; Mounting Type: Surface Mount; Operating Temperature: -55°C ~ 150°C (TJ); Package / Case: DO-214AC, SMA; Packaging: TapeAndReel; PartId: 7536; Part Status: Active; Price: 0.31; Series: Automotive, AEC-Q101, SM4TY, TRANSIL™; Supplier 1: DigiKey; Supplier Part Number 1: 497-10932-1-ND; Supplier Device Package: SMA (DO-214AC); Voltage - Clamping (Max) @ Ipp: 13.4V; Voltage - Reverse Standoff (Typ): 5V
footprint DO214AC SMA
pins: 1, 2

## SM4T7V6CAY
designator D?
TVS DIODE 6.5V 14.5V SMA; Manufacturer: STMicroelectronics; Bidirectional Channels: 1; Current - Peak Pulse (10/1000µs): 160A (8/20µs); Power Line Protection: No; Power - Peak Pulse: 400W; Type: Zener; Voltage - Breakdown (Min): 7.2V; Part Number: SM4T7V6CAY; Applications: Automotive; ComponentLink1Description: Datasheet; ComponentLink1URL: http://www.st.com/content/ccc/resource/technical/document/datasheet/8f/86/c4/c9/63/e2/4c/58/CD00283395.pdf/files/CD00283395.pdf/jcr:content/translations/en.CD00283395.pdf; ComponentLink2Description: DigiKey Link; ComponentLink2URL: http://digikey.com/product-detail/en/stmicroelectronics/SM4T7V6CAY/497-11800-1-ND/2756620; LastUpdated: 9/2/2020 1:27:52 AM; Lifecycle Status: Active; Minimum Order: 1; Mounting Type: Surface Mount; Operating Temperature: -55°C ~ 150°C (TJ); Package / Case: DO-214AC, SMA; Packaging: TapeAndReel; PartId: 7433; Part Status: Active; Price: 0.18; Series: Automotive, AEC-Q101, SM4TY, TRANSIL™; Supplier 1: DigiKey; Supplier Part Number 1: 497-11800-1-ND; Supplier Device Package: SMA (DO-214AC); Voltage - Clamping (Max) @ Ipp: 14.5V; Voltage - Reverse Standoff (Typ): 6.5V
footprint DO214AC SMA
pins: 1, 2

## SM4T10AY
designator D?
TVS DIODE 8.5V 19.5V SMA; Manufacturer: STMicroelectronics; Current - Peak Pulse (10/1000µs): 124A (8/20µs); Power Line Protection: No; Power - Peak Pulse: 400W; Type: Zener; Unidirectional Channels: 1; Voltage - Breakdown (Min): 9.4V; Part Number: SM4T10AY; Applications: Automotive; ComponentLink1Description: Datasheet; ComponentLink1URL: http://www.st.com/content/ccc/resource/technical/document/datasheet/8f/86/c4/c9/63/e2/4c/58/CD00283395.pdf/files/CD00283395.pdf/jcr:content/translations/en.CD00283395.pdf; ComponentLink2Description: DigiKey Link; ComponentLink2URL: http://digikey.com/product-detail/en/stmicroelectronics/SM4T10AY/497-11788-1-ND/2756629; LastUpdated: 9/2/2020 1:20:13 AM; Lifecycle Status: Active; Minimum Order: 1; Mounting Type: Surface Mount; Operating Temperature: -55°C ~ 150°C (TJ); Package / Case: DO-214AC, SMA; Packaging: TapeAndReel; PartId: 5573; Part Status: Active; Price: 0.17; Series: Automotive, AEC-Q101, SM4TY, TRANSIL™; Supplier 1: DigiKey; Supplier Part Number 1: 497-11788-1-ND; Supplier Device Package: SMA (DO-214AC); Voltage - Clamping (Max) @ Ipp: 19.5V; Voltage - Reverse Standoff (Typ): 8.5V
footprint DO214AC SMA
pins: 1, 2

## SM4T10CAY
designator D?
TVS DIODE 8.5V 19.5V SMA; Manufacturer: STMicroelectronics; Bidirectional Channels: 1; Current - Peak Pulse (10/1000µs): 124A (8/20µs); Power Line Protection: No; Power - Peak Pulse: 400W; Type: Zener; Voltage - Breakdown (Min): 9.4V; Part Number: SM4T10CAY; Applications: Automotive; ComponentLink1Description: Datasheet; ComponentLink1URL: http://www.st.com/content/ccc/resource/technical/document/datasheet/8f/86/c4/c9/63/e2/4c/58/CD00283395.pdf/files/CD00283395.pdf/jcr:content/translations/en.CD00283395.pdf; ComponentLink2Description: DigiKey Link; ComponentLink2URL: http://digikey.com/product-detail/en/stmicroelectronics/SM4T10CAY/497-11789-1-ND/2756619; LastUpdated: 9/2/2020 1:27:52 AM; Lifecycle Status: Active; Minimum Order: 1; Mounting Type: Surface Mount; Operating Temperature: -55°C ~ 150°C (TJ); Package / Case: DO-214AC, SMA; Packaging: TapeAndReel; PartId: 7434; Part Status: Active; Price: 0.18; Series: Automotive, AEC-Q101, SM4TY, TRANSIL™; Supplier 1: DigiKey; Supplier Part Number 1: 497-11789-1-ND; Supplier Device Package: SMA (DO-214AC); Voltage - Clamping (Max) @ Ipp: 19.5V; Voltage - Reverse Standoff (Typ): 8.5V
footprint DO214AC SMA
pins: 1, 2

## SM4T12AY
designator D?
TVS DIODE 10VWM 21.7VC SMA; Manufacturer: STMicroelectronics; Current - Peak Pulse (10/1000µs): 106A (8/20µs); Power Line Protection: No; Power - Peak Pulse: 400W; Type: Zener; Unidirectional Channels: 1; Voltage - Breakdown (Min): 11.1V; Voltage - Clamping (Max) @ Ipp: 21.7V; Voltage - Reverse Standoff (Typ): 10V; Part Number: SM4T12AY; Applications: Automotive; ComponentLink1Description: Datasheet; ComponentLink1URL: http://www.st.com/content/ccc/resource/technical/document/datasheet/8f/86/c4/c9/63/e2/4c/58/CD00283395.pdf/files/CD00283395.pdf/jcr:content/translations/en.CD00283395.pdf; ComponentLink2Description: DigiKey Link; ComponentLink2URL: http://digikey.com/product-detail/en/stmicroelectronics/SM4T12AY/497-11790-1-ND/2756618; LastUpdated: 9/2/2020 1:20:14 AM; Lifecycle Status: Active; Minimum Order: 1; Mounting Type: Surface Mount; Operating Temperature: -55°C ~ 150°C (TJ); Package / Case: DO-214AC, SMA; Packaging: TapeAndReel; PartId: 5726; Part Status: Active; Price: 0.17; Series: Automotive, AEC-Q101, SM4TY, TRANSIL™; Supplier 1: DigiKey; Supplier Part Number 1: 497-11790-1-ND; Supplier Device Package: SMA (DO-214AC)
footprint DO214AC SMA
pins: 1, 2

## SM4T12CAY
designator D?
TVS DIODE 10V 21.7V SMA; Manufacturer: STMicroelectronics; Bidirectional Channels: 1; Current - Peak Pulse (10/1000µs): 106A (8/20µs); Power Line Protection: No; Power - Peak Pulse: 400W; Type: Zener; Voltage - Breakdown (Min): 11.1V; Part Number: SM4T12CAY; Applications: Automotive; ComponentLink1Description: Datasheet; ComponentLink1URL: http://www.st.com/content/ccc/resource/technical/document/datasheet/8f/86/c4/c9/63/e2/4c/58/CD00283395.pdf/files/CD00283395.pdf/jcr:content/translations/en.CD00283395.pdf; ComponentLink2Description: DigiKey Link; ComponentLink2URL: http://digikey.com/product-detail/en/stmicroelectronics/SM4T12CAY/497-11791-1-ND/2756617; LastUpdated: 9/2/2020 1:27:51 AM; Lifecycle Status: Active; Minimum Order: 1; Mounting Type: Surface Mount; Operating Temperature: -55°C ~ 150°C (TJ); Package / Case: DO-214AC, SMA; Packaging: TapeAndReel; PartId: 7360; Part Status: Active; Price: 0.18; Series: Automotive, AEC-Q101, SM4TY, TRANSIL™; Supplier 1: DigiKey; Supplier Part Number 1: 497-11791-1-ND; Supplier Device Package: SMA (DO-214AC); Voltage - Clamping (Max) @ Ipp: 21.7V; Voltage - Reverse Standoff (Typ): 10V
footprint DO214AC SMA
pins: 1, 2

## SM4T14AY
designator D?
TVS DIODE 12V 25.3V SMA; Manufacturer: STMicroelectronics; Current - Peak Pulse (10/1000µs): 91A (8/20µs); Power Line Protection: No; Power - Peak Pulse: 400W; Type: Zener; Unidirectional Channels: 1; Voltage - Breakdown (Min): 13.3V; Part Number: SM4T14AY; Applications: Automotive; ComponentLink1Description: Datasheet; ComponentLink1URL: http://www.st.com/content/ccc/resource/technical/document/datasheet/8f/86/c4/c9/63/e2/4c/58/CD00283395.pdf/files/CD00283395.pdf/jcr:content/translations/en.CD00283395.pdf; ComponentLink2Description: DigiKey Link; ComponentLink2URL: http://digikey.com/product-detail/en/stmicroelectronics/SM4T14AY/497-11792-1-ND/2756616; LastUpdated: 9/2/2020 1:20:18 AM; Lifecycle Status: Active; Minimum Order: 1; Mounting Type: Surface Mount; Operating Temperature: -55°C ~ 150°C (TJ); Package / Case: DO-214AC, SMA; Packaging: TapeAndReel; PartId: 6166; Part Status: Active; Price: 0.17; Series: Automotive, AEC-Q101, SM4TY, TRANSIL™; Supplier 1: DigiKey; Supplier Part Number 1: 497-11792-1-ND; Supplier Device Package: SMA (DO-214AC); Voltage - Clamping (Max) @ Ipp: 25.3V; Voltage - Reverse Standoff (Typ): 12V
footprint DO214AC SMA
pins: 1, 2

## SM4T14CAY
designator D?
TVS DIODE 12V 25.3V SMA; Manufacturer: STMicroelectronics; Bidirectional Channels: 1; Current - Peak Pulse (10/1000µs): 91A (8/20µs); Power Line Protection: No; Power - Peak Pulse: 400W; Type: Zener; Voltage - Breakdown (Min): 13.3V; Part Number: SM4T14CAY; Applications: Automotive; ComponentLink1Description: Datasheet; ComponentLink1URL: http://www.st.com/content/ccc/resource/technical/document/datasheet/8f/86/c4/c9/63/e2/4c/58/CD00283395.pdf/files/CD00283395.pdf/jcr:content/translations/en.CD00283395.pdf; ComponentLink2Description: DigiKey Link; ComponentLink2URL: http://digikey.com/product-detail/en/stmicroelectronics/SM4T14CAY/497-11793-1-ND/2756613; LastUpdated: 9/2/2020 1:27:55 AM; Lifecycle Status: Active; Minimum Order: 1; Mounting Type: Surface Mount; Operating Temperature: -55°C ~ 150°C (TJ); Package / Case: DO-214AC, SMA; Packaging: TapeAndReel; PartId: 7795; Part Status: Active; Price: 0.18; Series: Automotive, AEC-Q101, SM4TY, TRANSIL™; Supplier 1: DigiKey; Supplier Part Number 1: 497-11793-1-ND; Supplier Device Package: SMA (DO-214AC); Voltage - Clamping (Max) @ Ipp: 25.3V; Voltage - Reverse Standoff (Typ): 12V
footprint DO214AC SMA
pins: 1, 2

## SM4T15AY
designator D?
TVS DIODE 13V 27.2V SMA; Manufacturer: STMicroelectronics; Current - Peak Pulse (10/1000µs): 85A (8/20µs); Power Line Protection: No; Power - Peak Pulse: 400W; Type: Zener; Unidirectional Channels: 1; Voltage - Breakdown (Min): 14.4V; Part Number: SM4T15AY; Applications: Automotive; ComponentLink1Description: Datasheet; ComponentLink1URL: http://www.st.com/content/ccc/resource/technical/document/datasheet/8f/86/c4/c9/63/e2/4c/58/CD00283395.pdf/files/CD00283395.pdf/jcr:content/translations/en.CD00283395.pdf; ComponentLink2Description: DigiKey Link; ComponentLink2URL: http://digikey.com/product-detail/en/stmicroelectronics/SM4T15AY/497-11794-1-ND/2756614; LastUpdated: 9/2/2020 1:20:14 AM; Lifecycle Status: Active; Minimum Order: 1; Mounting Type: Surface Mount; Operating Temperature: -55°C ~ 150°C (TJ); Package / Case: DO-214AC, SMA; Packaging: TapeAndReel; PartId: 5725; Part Status: Active; Price: 0.17; Series: Automotive, AEC-Q101, SM4TY, TRANSIL™; Supplier 1: DigiKey; Supplier Part Number 1: 497-11794-1-ND; Supplier Device Package: SMA (DO-214AC); Voltage - Clamping (Max) @ Ipp: 27.2V; Voltage - Reverse Standoff (Typ): 13V
footprint DO214AC SMA
pins: 1, 2

## SM4T15CAY
designator D?